# Altium footprint library dAir.PcbLib: 34 footprints (part 2 of 3)
Each footprint in its own frame and in the unit in brackets; x right, y up, seen from the top. Pads: shape width x height; smd on the part's side, far side on the other; paste and mask are expansions set on the pad; w line width, h text height; cw(c..) or ccw(c..) is an arc to the next point about the centre after c.
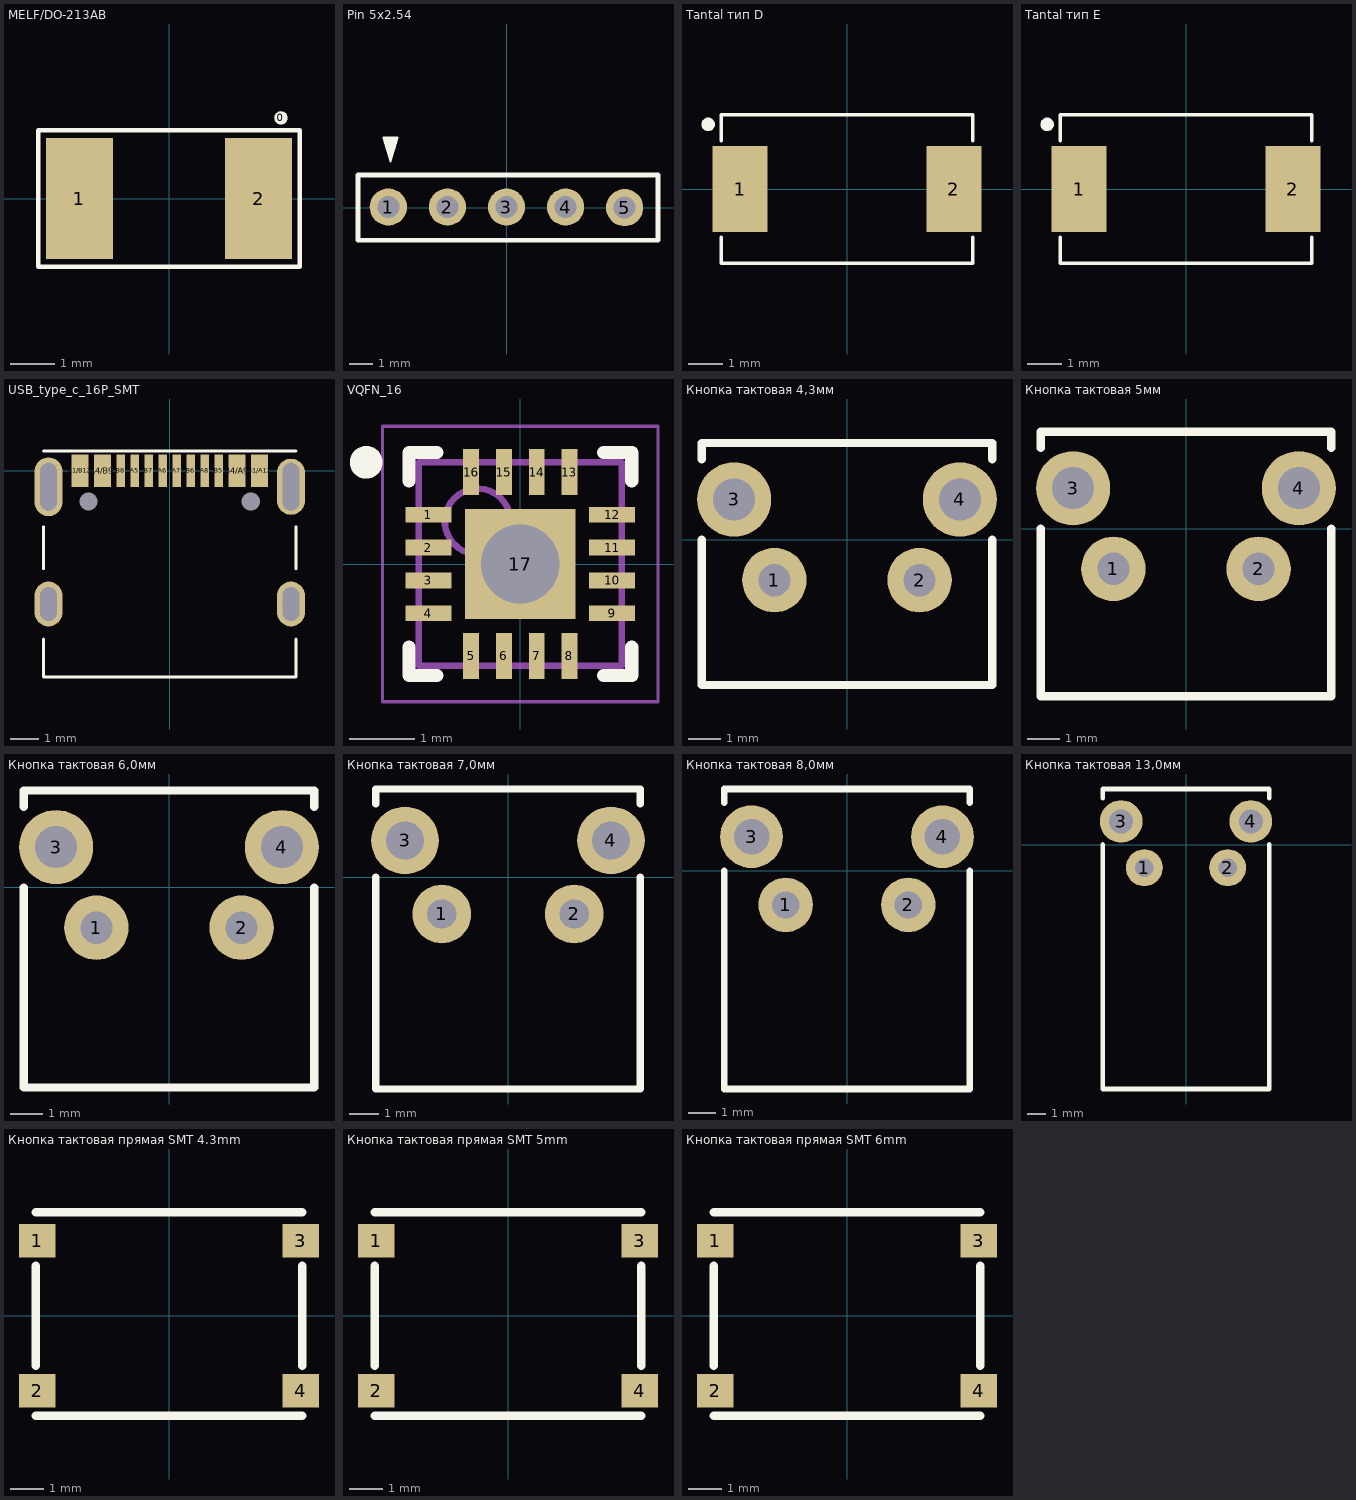
[diagram p1: the footprints below, top view; thin cyan lines are the x and y axes]

## MELF/DO-213AB [mm]
pads (3):
  round 0.3 on Top Overlay: 0(2.5,1.8)
  rect 1.5x2.7 smd: 1(-2,0) 2(2,0)
Top Overlay:
  lines w0.1: -2.925,-1.525 -2.925,1.525 2.925,1.525 2.925,-1.525 -2.925,-1.525
3D body "User Library-MELF.STEP": height 2.5, standoff 0, extent -2.512,-1.25 2.488,1.25

## Pin 5x2.54 [mm]
pads (5):
  round 1.6 hole 0.95: 1(-5.095,0.025) 2(-2.555,0.025) 3(-0.015,0.025) 4(2.525,0.025) 5(5.065,0)
Top Overlay:
  region: -5,2 -5.175,2.525 -5.3,3 -4.7,3 -4.825,2.525
  lines w0.1: -5.3,3 -5,2 -4.7,3 -5.3,3
  lines w0.2: -6.4,-1.4 6.5,-1.4 6.5,1.4 -6.4,1.4 -6.4,-1.4
3D body "PLS-2.STEP": height 8.54, standoff -3, extent -6.315,-1.265 -1.235,1.275
3D body "PLS-3.STEP": height 8.54, standoff -3, extent -1.235,-1.275 6.385,1.265

## SOP6 [mm]

## Tantal тип D [mm]
pads (3):
  rect 1.6x2.5 smd: 1(-3.1,0) 2(3.1,0)
  round 0.4 on Top Overlay: ""(-4.025,1.875)
Top Overlay:
  lines w0.1: -3.65,-1.4 -3.65,-2.15 0,-2.15 3.65,-2.15 3.65,-1.4 ; -3.65,1.4 -3.65,2.15 0,2.15 3.65,2.15 3.65,1.4
3D body "User Library-Tantal D.STEP": height 2.7, standoff -0.1, extent -3.65,-2.15 3.65,2.15

## Tantal тип E [mm]
pads (3):
  rect 1.6x2.5 smd: 1(-3.1,0) 2(3.1,0)
  round 0.4 on Top Overlay: ""(-4.025,1.875)
Top Overlay:
  lines w0.1: -3.65,-1.4 -3.65,-2.15 0,-2.15 3.65,-2.15 3.65,-1.4 ; -3.65,1.4 -3.65,2.15 0,2.15 3.65,2.15 3.65,1.4
3D body "User Library-Tnatal case E.STEP": height 4, standoff 0, extent -3.8,-2.3 3.8,2.3

## USB_type_c_16P_SMT [mm]
pads (18):
  rect 0.6x1.15 smd: A1/B12(-3.2,0) A4/B9(-2.4,0) B1/A12(3.2,0) B4/A9(2.4,0)
  rect 0.3x1.15 smd: A5(-1.25,0) A6(-0.25,0) A7(0.25,0) A8(1.25,0) B5(1.75,0) B6(0.75,0) B7(-0.75,0) B8(-1.75,0)
  oval 1x1.6 hole 0.6 slot 1.2 at 90 deg: ""(-4.32,-4.755) ""(4.32,-4.755)
  oval 1x2.1 hole 0.6 slot 1.7 at 90 deg: ""(-4.32,-0.575)
  oval 0x0.1 hole 0.65 unplated: ""(-2.89,-1.1)
  round 0 hole 0.65 unplated: ""(2.89,-1.1)
  oval 1x2 hole 0.6 slot 1.7 at 90 deg: ""(4.32,-0.575)
Top Overlay:
  lines w0.1: -4.5,-6 -4.5,-7.355 4.5,-7.355 4.5,-6 ; -4.5,-3.5 -4.5,-2 ; -4.5,0.7 4.5,0.7 ; 4.5,-3.5 4.5,-2
3D body "HRO_TYPE-C-31-M-12.step": height 3.21, standoff -0.99, extent -4.475,-7.35 4.475,0.55

## VQFN_16 [mm] "QFN, 16-Leads, Body 3,00x3,00mm, Pitch 0,50mm, Thermal Pad 1,68x1,68mm, IPC Medium Density"
height 1
pads (17):
  rect 0.7x0.24 smd: 1(-1.4,0.75) 2(-1.4,0.25) 3(-1.4,-0.25) 4(-1.4,-0.75) 9(1.4,-0.75) 10(1.4,-0.25) 11(1.4,0.25) 12(1.4,0.75)
  rect 0.24x0.7 smd: 5(-0.75,-1.4) 6(-0.25,-1.4) 7(0.25,-1.4) 8(0.75,-1.4) 13(0.75,1.4) 14(0.25,1.4) 15(-0.25,1.4) 16(-0.75,1.4)
  rect 1.68x1.68 smd: 17(0,0)
via 0,0 diameter 1.4 hole 1.2
Top Overlay:
  circle w0.25: c-2.35,1.55 r0.125
  lines w0.2: -1.7,-1.27 -1.7,-1.7 -1.27,-1.7 ; -1.7,1.27 -1.7,1.7 -1.27,1.7 ; 1.27,-1.7 1.7,-1.7 1.7,-1.27 ; 1.27,1.7 1.7,1.7 1.7,1.27
Mechanical 13:
  circle w0.1: c-0.65,0.65 r0.5
  lines w0.1: -1.55,-1.55 -1.55,1.55 1.55,1.55 1.55,-1.55 -1.55,-1.55
Mechanical 15:
  lines w0.05: -2.1,-2.1 -2.1,2.1 2.1,2.1 2.1,-2.1 -2.1,-2.1
  lines w0.1: -0.5,0 0.5,0 ; 0,-0.5 0,0.5
3D body "QFN50P300X300X100_HS-17N.step": height 1, standoff 0, extent -1.56,-1.56 1.56,1.56

## Кнопка тактовая 4,3мм [mm]
pads (4):
  round 2 hole 1: 1(-2.25,-1.25) 2(2.25,-1.25)
  round 2.3 hole 1.3: 3(-3.5,1.25) 4(3.5,1.25)
Top Overlay:
  lines w0.254: -4.5,0 -4.5,-4.5 4.5,-4.5 4.5,0 ; -4.5,2.5 -4.5,3 4.5,3 4.5,2.5
3D body "TS6-THT-RA_H-4.3.step": height 7, standoff -3.5, extent -4.197,-4.3 4.197,2.75

## Кнопка тактовая 5мм [mm]
pads (4):
  round 2 hole 1: 1(-2.25,-1.25) 2(2.25,-1.25)
  round 2.3 hole 1.3: 3(-3.5,1.25) 4(3.5,1.25)
Top Overlay:
  lines w0.254: -4.5,0 -4.5,-5.2 4.5,-5.2 4.5,0 ; -4.5,2.5 -4.5,3 4.5,3 4.5,2.5
3D body "TS6-THT-RA_H-5.0.step": height 7, standoff -3.5, extent -4.197,-5 4.197,2.75

## Кнопка тактовая 6,0мм [mm]
pads (4):
  round 2 hole 1: 1(-2.25,-1.25) 2(2.25,-1.25)
  round 2.3 hole 1.3: 3(-3.5,1.25) 4(3.5,1.25)
Top Overlay:
  lines w0.254: -4.5,0 -4.5,-6.2 4.5,-6.2 4.5,0 ; -4.5,2.5 -4.5,3 4.5,3 4.5,2.5
3D body "TS6-THT-RA_H-6.0.step": height 7, standoff -3.5, extent -4.197,-6 4.197,2.75

## Кнопка тактовая 7,0мм [mm]
pads (4):
  round 2 hole 1: 1(-2.25,-1.25) 2(2.25,-1.25)
  round 2.3 hole 1.3: 3(-3.5,1.25) 4(3.5,1.25)
Top Overlay:
  lines w0.254: -4.5,0 -4.5,-7.2 4.5,-7.2 4.5,0 ; -4.5,2.5 -4.5,3 4.5,3 4.5,2.5
3D body "TS6-THT-RA_H-7.0.step": height 7, standoff -3.5, extent -4.197,-7 4.197,2.75

## Кнопка тактовая 8,0мм [mm]
pads (4):
  round 2 hole 1: 1(-2.25,-1.25) 2(2.25,-1.25)
  round 2.3 hole 1.3: 3(-3.5,1.25) 4(3.5,1.25)
Top Overlay:
  lines w0.254: -4.5,0 -4.5,-8 4.5,-8 4.5,0 ; -4.5,2.5 -4.5,3 4.5,3 4.5,2.5
3D body "TS6-THT-RA_H-8.0.step": height 7, standoff -3.5, extent -4.197,-8 4.197,2.75

## Кнопка тактовая 13,0мм [mm]
pads (4):
  round 2 hole 1: 1(-2.25,-1.25) 2(2.25,-1.25)
  round 2.3 hole 1.3: 3(-3.5,1.25) 4(3.5,1.25)
Top Overlay:
  lines w0.254: -4.5,0 -4.5,-13.2 4.5,-13.2 4.5,0 ; -4.5,2.5 -4.5,3 4.5,3 4.5,2.5
3D body "TS6-THT-RA_H-13.0.step": height 7, standoff -3.5, extent -4.197,-13 4.197,2.75

## Кнопка тактовая прямая SMT 4.3mm [mm]
pads (4):
  rect 1.1x1 smd: 1(-3.95,2.25) 2(-3.95,-2.25) 3(3.95,2.25) 4(3.95,-2.25)
Top Overlay:
  lines w0.254: -4,-3 4,-3 ; -4,-1.5 -4,1.5 ; -4,3.1 4,3.1 ; 4,-1.5 4,1.5
3D body "TS6-SMT_H-4.3.step": height 4.3, standoff 0, extent -4,-3 4,3

## Кнопка тактовая прямая SMT 5mm [mm]
pads (4):
  rect 1.1x1 smd: 1(-3.95,2.25) 2(-3.95,-2.25) 3(3.95,2.25) 4(3.95,-2.25)
Top Overlay:
  lines w0.254: -4,-3 4,-3 ; -4,-1.5 -4,1.5 ; -4,3.1 4,3.1 ; 4,-1.5 4,1.5
3D body "TS6-SMT_H-5.0.step": height 5, standoff 0, extent -4,-3 4,3

## Кнопка тактовая прямая SMT 6mm [mm]
pads (4):
  rect 1.1x1 smd: 1(-3.95,2.25) 2(-3.95,-2.25) 3(3.95,2.25) 4(3.95,-2.25)
Top Overlay:
  lines w0.254: -4,-3 4,-3 ; -4,-1.5 -4,1.5 ; -4,3.1 4,3.1 ; 4,-1.5 4,1.5
3D body "TS6-SMT_H-6.0.step": height 6, standoff 0, extent -4,-3 4,3